# Altium footprint library Component.PcbLib: 115 footprints (part 6 of 8)
Each footprint in its own frame and in the unit in brackets; x right, y up, seen from the top. Pads: shape width x height; smd on the part's side, far side on the other; paste and mask are expansions set on the pad; w line width, h text height; cw(c..) or ccw(c..) is an arc to the next point about the centre after c.
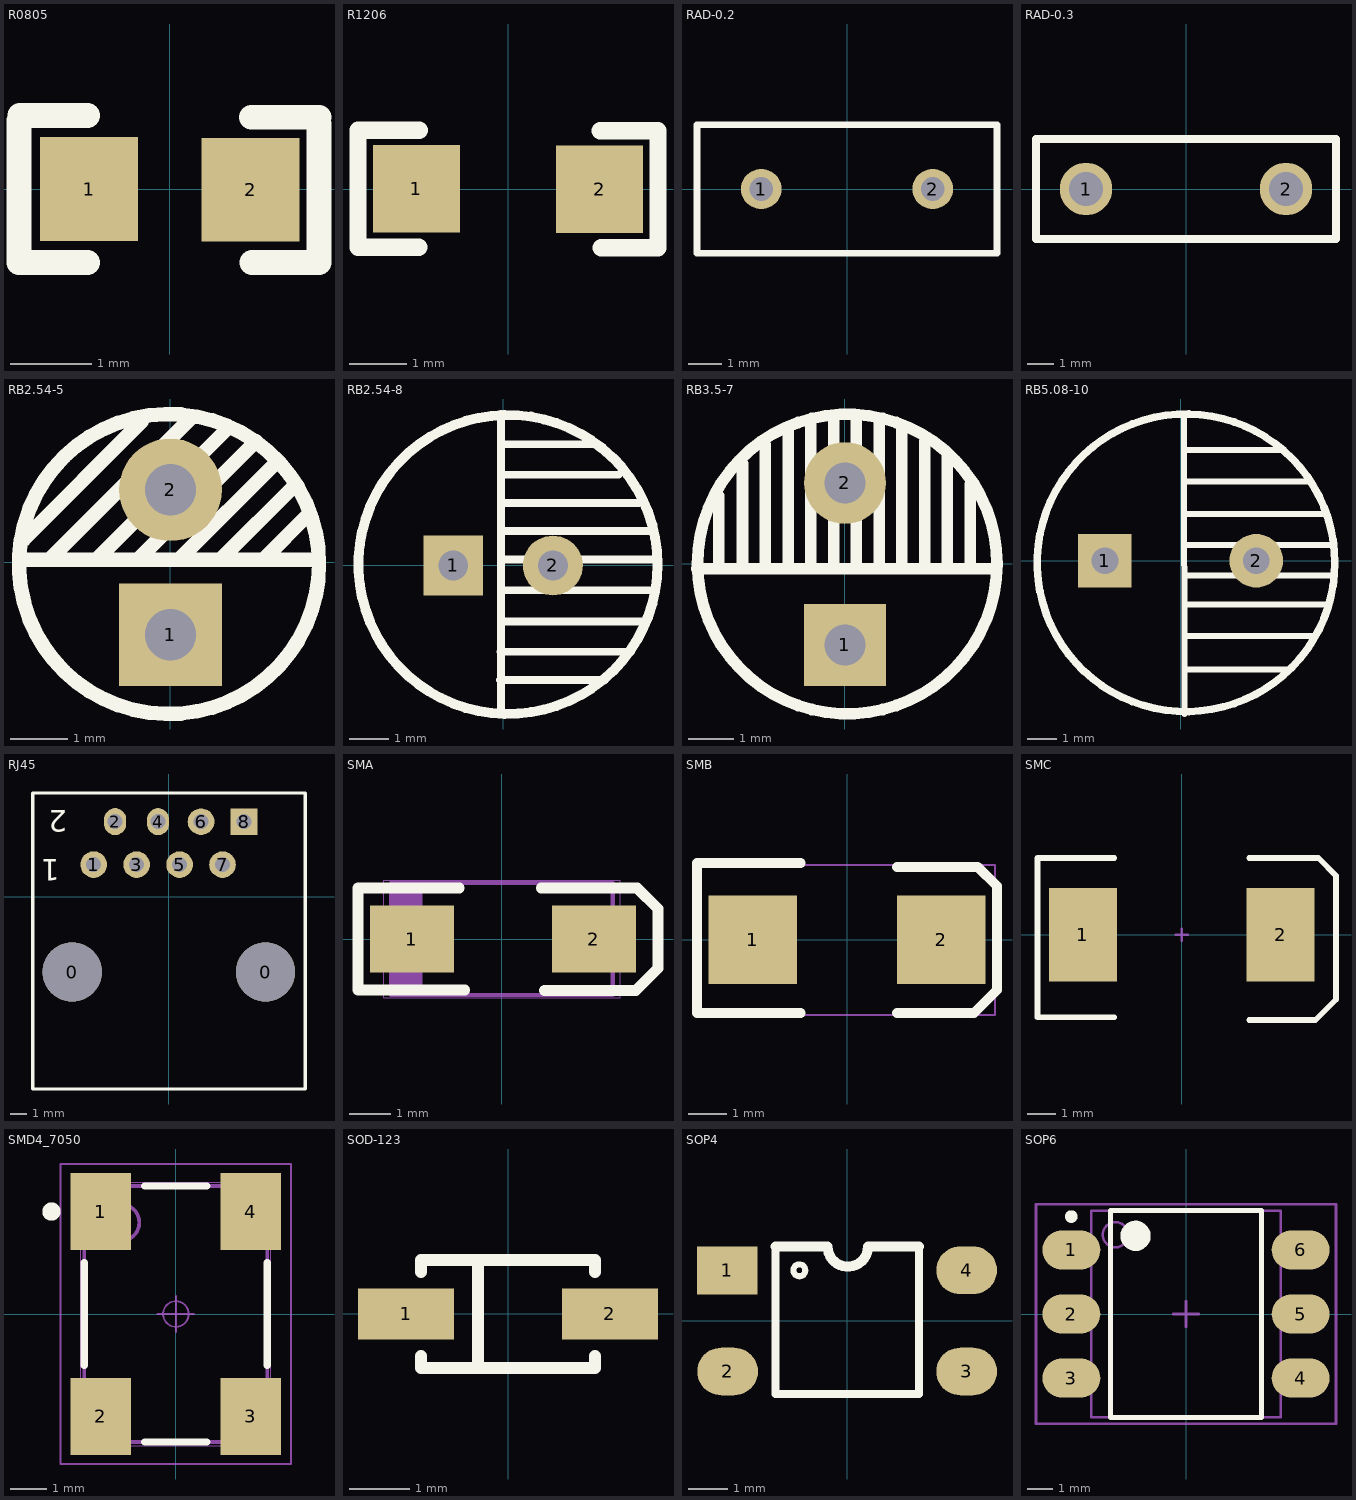
[diagram p5: the footprints below, top view; thin cyan lines are the x and y axes]

## R0805 [mm]
pads (2):
  rect 1.2x1.27 smd: 1(-0.99,0.005) 2(0.99,-0.005)
Top Overlay:
  lines w0.305: -1.85,-0.895 -1.85,0.845 ; -1.84,0.905 -1.01,0.905 ; -1.82,-0.895 -1.01,-0.895 ; 1,0.885 1.83,0.885 ; 1.01,-0.895 1.83,-0.895 1.83,0.805
3D body: height 0.78, standoff 0, extent -1.02,-0.61 0.98,0.64

## R1206 [mm]
height 1.99
pads (2):
  rect 1.524x1.524 smd: 1(-1.6,0.005) 2(1.6,-0.005)
Top Overlay:
  lines w0.305: -1.56,-1.015 -2.62,-1.015 -2.62,1.025 ; 1.61,1.015 2.62,1.015 2.62,-1.025 1.63,-1.025 ; -2.62,1.025 -1.55,1.025 -2.62,1.025
3D body: height 1, standoff 0, extent -1.602,-0.795 1.598,0.805

## RAD-0.2 [mm] "Radial Cap, Thru-Hole; 2 Leads; 0.2 in Pin Spacing"
pads (2):
  round 1.2 hole 0.7: 1(-2.54,0) 2(2.54,0)
Top Overlay:
  lines w0.2: -4.445,-1.905 -4.445,1.905 4.445,1.905 4.445,-1.905 -4.445,-1.905

## RAD-0.3 [mm]
height 1.99
pads (2):
  round 2 hole 1.3: 1(-3.81,0) 2(3.81,0)
Top Overlay:
  lines w0.305: -5.715,-1.905 -5.715,1.905 5.715,1.905 5.715,-1.905 -5.715,-1.905
3D body: height 1, standoff 0, extent -4.43,-0.599 -3.235,0.599
3D body: height 1, standoff 0, extent 3.19,-0.599 4.385,0.599
3D body: height 5, standoff 0, extent -5.61,-1 5.59,1

## RB2.54-5 [mm] "直插电解电容"
pads (2):
  rect 1.8x1.8 hole 0.9: 1(0,-1.27)
  round 1.8 hole 0.9: 2(0,1.27)
Top Overlay:
  circle w0.254: c-0.025,-0.03 r2.629
  lines w0.254: -1.275,0.07 1,2.345 -1.275,0.07 ; -1.275,0.07 -1.275,0.045 -1.275,0.07 ; 0.925,0.095 2.15,1.32 0.925,0.095 ; 0.925,0.095 0.925,0.07 0.925,0.095 ; -2.65,0.045 2.525,0.045 -2.65,0.045 ; -2.575,0.395 -0.5,2.47 -2.575,0.395 ; -2.1,0.07 0.375,2.545 -2.1,0.07 ; -0.575,0.045 1.5,2.12 -0.575,0.045 ; 0.175,0.07 1.85,1.745 0.175,0.07 ; 1.65,0.07 2.4,0.82 1.65,0.07
3D body: height 1, standoff 0, extent -0.498,0.732 0.498,1.73
3D body: height 1, standoff 0, extent -0.5,-1.769 0.496,-0.771
3D body: height 11.7, standoff -3.4, extent -2.57,-2.529 2.509,2.549

## RB2.54-8 [mil] "直插电解电容"
pads (2):
  rect 60x60 hole 30: 1(-50,0)
  round 60 hole 30: 2(50,0)
Top Overlay:
  circle w10: c4.96,1 r150.04
  lines w7.87: -2.94,-114.96 102.18,-114.96 ; -2.54,-86.61 128.56,-86.61 ; -2.15,-146.85 -2.15,151.97 ; -2.15,-56.3 141.94,-56.3 ; -2.15,-24.8 153.36,-24.8 ; -2.15,5.91 150.09,5.91 ; -2.15,34.65 148.24,34.65 ; -2.15,62.6 136.04,62.6 ; -2.15,90.94 115.96,90.94 ; -2.15,121.65 94.31,121.65 ; 42.73,-143.7 44.31,-143.7
3D body: height 453.76, standoff -128.81, extent -130,-125.01 120.03,125.01

## RB3.5-7 [mm] "直插电解电容"
pads (2):
  rect 1.8x1.8 hole 0.9: 1(0,-1.778)
  round 1.8 hole 0.9: 2(0,1.778)
Top Overlay:
  circle w0.254: c0.05,-0.003 r3.289
  lines w0.254: -3.25,-0.103 3.325,-0.103 ; -2.775,-0.078 -2.775,1.497 ; -2.25,-0.028 -2.25,2.197 ; -1.75,-0.028 -1.75,2.622 ; -1.25,-0.078 -1.25,2.972 ; -0.75,-0.053 -0.75,3.122 ; -0.25,-0.053 -0.25,3.197 ; 0.25,-0.053 0.25,3.247 ; 0.75,-0.028 0.75,3.147 ; 1.25,-0.028 1.25,2.947 ; 1.75,-0.053 1.75,2.697 ; 2.25,-0.053 2.25,2.397 ; 2.75,-0.028 2.75,1.747
3D body: height 11.7, standoff -3.4, extent -2.42,-2.357 2.659,2.721

## RB5.08-10 [mm] "直插电解电容"
pads (2):
  rect 1.8x1.8 hole 0.9: 1(-2.542,0)
  round 1.8 hole 0.9: 2(2.542,0)
Top Overlay:
  circle w0.254: c0.182,-0.07 r5
  lines w0.2: 0.12,4.81 0.132,-5.15 ; 0.174,3.718 3.384,3.718 ; 0.175,2.655 4.307,2.655 ; 0.177,1.569 4.782,1.569 ; 0.178,0.528 5.161,0.528 ; 0.179,-0.491 5.152,-0.491 ; 0.181,-1.466 4.952,-1.466 ; 0.182,-2.529 4.513,-2.529 ; 0.221,-3.65 3.692,-3.65
3D body: height 16.53, standoff -3.74, extent -5.025,-5.025 5.026,5.026

## RJ45 [mil]
height 78.35
pads (10):
  round 137.8 hole 137.8: 0(-225,-175) 0(225,-175)
  round 62 hole 35: 1(-175,75) 3(-75,75) 5(25,75) 6(75,175) 7(125,75)
  oval 51.18x62.99 hole 35: 2(-125,175) 4(-25,175)
  rect 62x62 hole 35: 8(175,175)
Top Overlay:
  lines w3.94: -316.54,-447.24 -316.54,-249.41
  lines w8: 317.32,-447.24 -316.54,-447.24 -316.54,241.67 317.32,241.67 317.32,-445.47
  text "2" at -236.81,200.98 h50
  text "1" at -253.74,87.99 h50
3D body: height 539.37, standoff -157.48, extent -315.75,-599.61 314.17,242.91

## SMA [mm]
pads (2):
  rect 2x1.6 smd: 1(-2.15,0) 2(2.2,0)
Top Overlay:
  lines w0.254: -1.016,1.22 -3.44,1.22 -3.44,-1.22 -0.889,-1.22 ; 0.94,1.22 3.23,1.22 3.73,0.72 3.73,-0.7 3.2,-1.23 1.016,-1.23
Mechanical 15:
  lines w0.1: -2.548,-1.335 -2.548,1.335 ; -2.448,-1.335 -2.448,1.335 ; -2.348,-1.335 -2.348,1.335 ; -2.248,-1.335 -2.248,1.335 ; -2.148,-1.335 -2.148,1.335 ; -2.047,-1.335 -2.047,1.335 ; -1.948,-1.335 -1.948,1.335 ; -2.648,-1.335 -2.648,1.335 2.648,1.335 2.648,-1.335 -2.648,-1.335
Mechanical 16:
  lines w0.001: -2.83,-1.4 -2.83,1.4 2.83,1.4 2.83,-1.4 -2.83,-1.4
3D body: height 2.44, standoff 0.16, extent -2.743,-1.397 2.743,1.397

## SMB [mm]
pads (2):
  rect 2.3x2.3 smd: 1(-2.45,0) 2(2.45,0)
Top Overlay:
  lines w0.254: -1.2,-1.9 -3.9,-1.9 -3.9,2 -1.2,2 ; 1.3,-1.9 3.3,-1.9 3.9,-1.3 3.9,1.4 3.4,1.9 1.3,1.9
Mechanical 16:
  lines w0.05: -3.85,-1.95 -3.85,1.95 3.85,1.95 3.85,-1.95 -3.85,-1.95
3D body: height 2.6, standoff -0.05, extent -2.794,-1.975 2.794,1.975

## SMC [mm] "DO-214-AB/SMC; 2 C-Bend Leads; Body 7.9 x 5.9 mm, inc. leads (LxW)"
height 2.65
pads (2):
  rect 2.4x3.3 smd: 1(-3.475,0) 2(3.475,0)
Top Overlay:
  lines w0.2: -2.375,-2.9 -5.075,-2.9 -5.075,2.7 -2.375,2.7 ; 2.375,-3 4.7,-3 5.425,-2.275 5.425,2.073 4.804,2.7 2.375,2.7
Mechanical 1:
  lines w0.1: -0.2,0 0.2,0 ; 0,-0.2 0,0.2
3D body: height 2.57, standoff -0.07, extent -4.318,-3.15 3.81,3.15

## SMD4_7050 [mm]
pads (4):
  rect 1.65x2.1 smd: 1(-2.05,2.8) 2(-2.05,-2.8) 3(2.05,-2.8) 4(2.05,2.8)
Top Overlay:
  circle w0.25: c-3.4,2.8 r0.125
  lines w0.2: -2.5,-1.4 -2.5,1.4 ; -0.85,-3.5 0.85,-3.5 ; -0.85,3.5 0.85,3.5 ; 2.5,-1.4 2.5,1.4
Mechanical 15:
  circle w0.1: c-1.5,2.5 r0.5
  lines w0.1: -2.5,-3.5 2.5,-3.5 2.5,3.5 -2.5,3.5 -2.5,-3.5
Mechanical 16:
  circle w0.05: c0,0 r0.35
  lines w0.001: -2.6,-3.6 2.6,-3.6 2.6,3.6 -2.6,3.6 -2.6,-3.6
  lines w0.05: -0.5,0 0.5,0 ; 0,-0.5 0,0.5 ; -3.15,-4.1 3.15,-4.1 3.15,4.1 -3.15,4.1 -3.15,-4.1
3D body: height 0.9, standoff -0.05, extent -1.676,-2.5 1.524,2.5

## SOD-123 [mm]
pads (2):
  rect 1.6x0.85 smd: 1(-1.7,0) 2(1.7,0)
Top Overlay:
  lines w0.2: -1.45,-0.7 -1.45,-0.9 1.45,-0.9 1.45,-0.7 ; -1.45,0.7 -1.45,0.9 1.45,0.9 1.45,0.7 ; -0.5,-0.9 -0.5,0.9
3D body: height 0.92, standoff -0.53, extent -1.925,-0.762 1.925,0.938

## SOP4 [mm]
height 1.99
pads (4):
  rect 1.524x1.2 smd: 1(-3.004,1.267)
  oval 1.524x1.2 smd: 2(-2.996,-1.27) 3(3.004,-1.27) 4(3.004,1.27)
Top Overlay:
  circle w0.15: c-1.196,1.27 r0.15
  lines w0.2: -1.796,1.87 -1.796,-1.83 1.804,-1.83 1.804,1.87
  lines w0.254: -1.796,1.87 -0.488,1.87 ccw(c0.02,1.87) 0.528,1.87 1.804,1.87
3D body: height 2.9, standoff 0, extent -3.346,-2.438 3.339,2.512

## SOP6 [mm] "SOP, 6-Leads, Body 8.2x7.5mm (max), Pitch 2.54mm, IPC Medium Density"
height 2.65
pads (6):
  oval 2.3x1.55 smd: 1(-4.55,2.54) 2(-4.55,0) 3(-4.55,-2.54) 4(4.55,-2.54) 5(4.55,0) 6(4.55,2.54)
Top Overlay:
  circle w0.6: c-2,3.1 r0.3
  circle w0.25: c-4.55,3.865 r0.125
  lines w0.2: -3,-4.1 3,-4.1 3,4.1 -3,4.1 -3,-4.1
Mechanical 13:
  circle w0.1: c-2.8,3.145 r0.5
  lines w0.1: -3.75,-4.095 3.75,-4.095 3.75,4.095 -3.75,4.095 -3.75,-4.095
Mechanical 15:
  lines w0.1: -0.5,0 0.5,0 ; 0,-0.5 0,0.5 ; -5.95,-4.35 5.95,-4.35 5.95,4.35 -5.95,4.35 -5.95,-4.35
3D body: height 4, standoff -0.08, extent -4.573,-4.27 4.593,4.24